# Altium footprint library General.PcbLib: 446 footprints (part 13 of 28)
Each footprint in its own frame and in the unit in brackets; x right, y up, seen from the top. Pads: shape width x height; smd on the part's side, far side on the other; paste and mask are expansions set on the pad; w line width, h text height; cw(c..) or ccw(c..) is an arc to the next point about the centre after c.
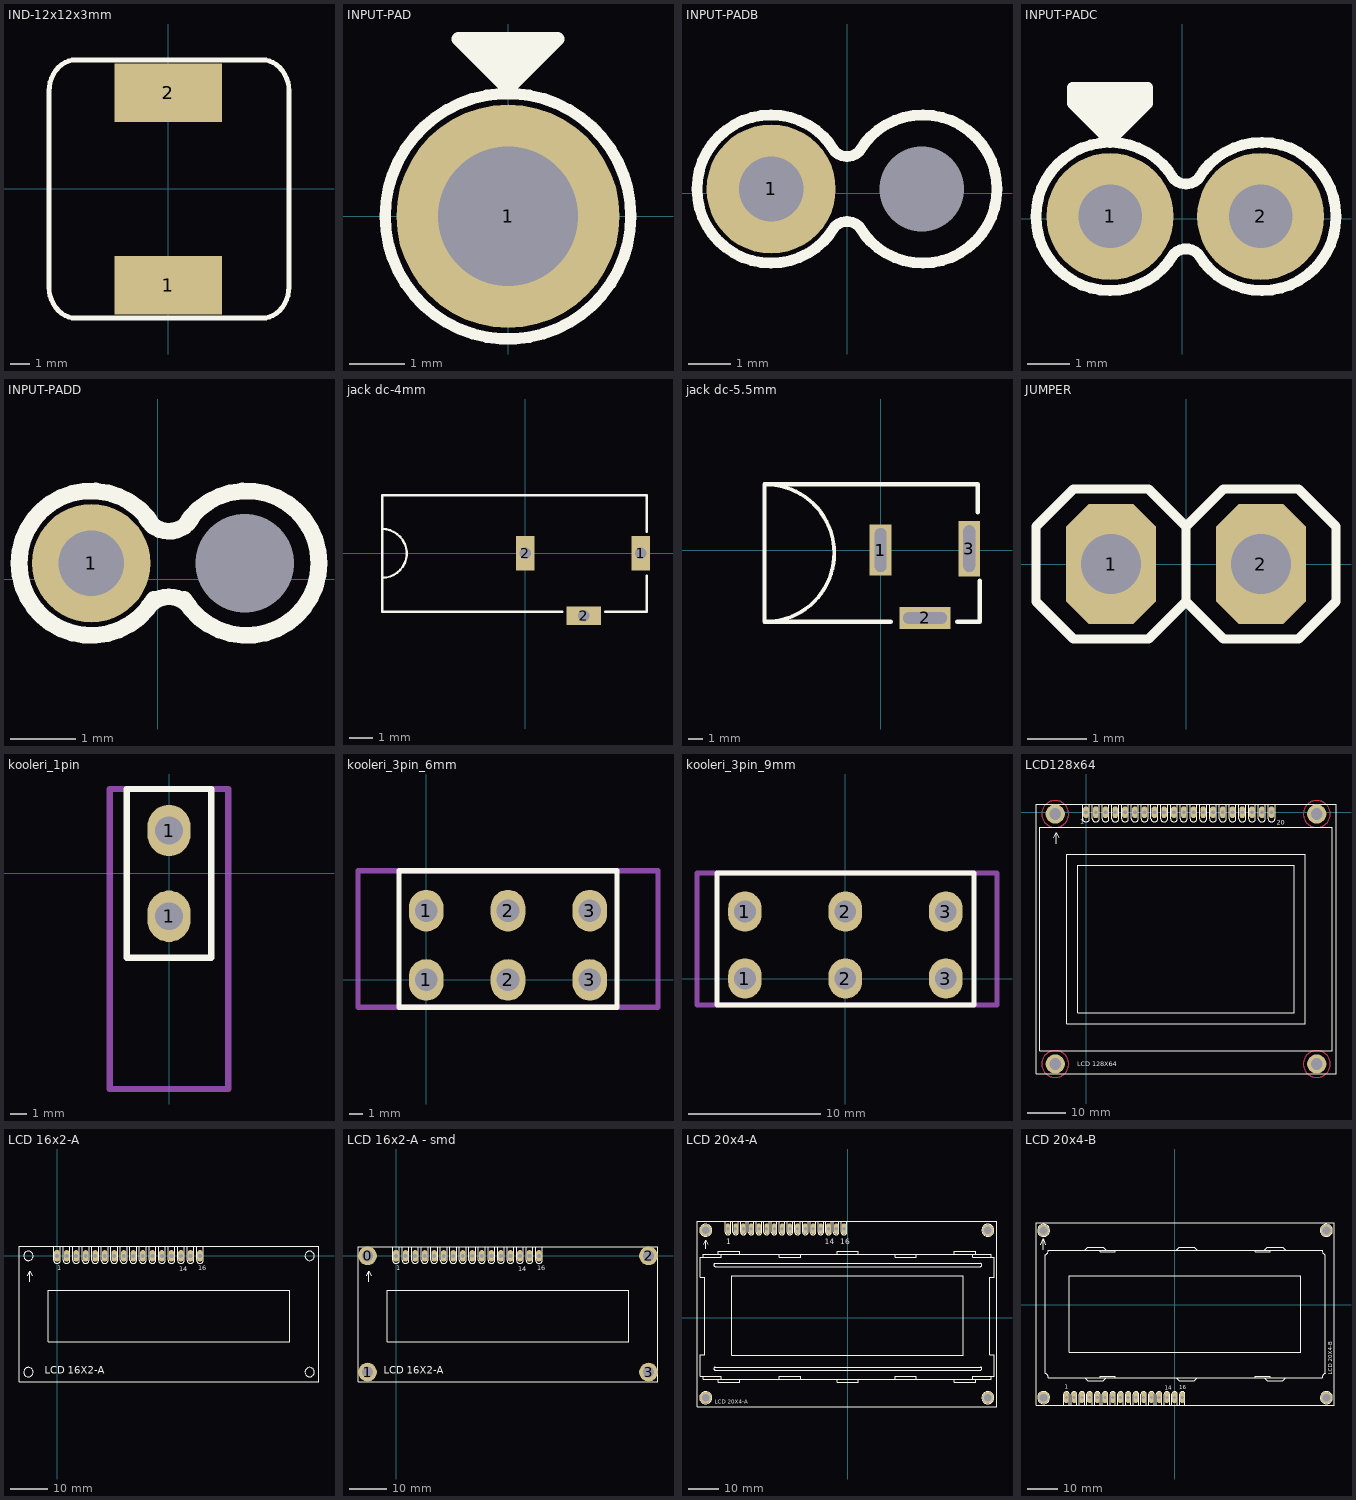
[diagram p12: the footprints below, top view; thin cyan lines are the x and y axes]

## IND-12x12x3mm [mm]
pads (2):
  rect 5.5x3 smd: 1(0,-4.978) 2(0,4.928)
Top Overlay:
  lines w0.254: -6.127,-5.059 ccw(c-4.373,-5.059) -5.613,-6.299 ccw(c-4.755,-5.441) -4.755,-6.655 ; -6.121,-5.029 -6.121,3.296 ; -6.122,-4.83 -6.122,-4.623 ; -6.122,-3.525 -6.122,4.801 -6.122,5.009 cw(c-4.368,5.009) -5.608,6.249 cw(c-4.75,5.39) -4.75,6.604 ; -4.75,-6.655 4.826,-6.655 ccw(c4.826,-5.441) 5.684,-6.299 ccw(c4.445,-5.059) 6.198,-5.059 6.198,-4.851 ; -4.674,6.604 4.831,6.604 cw(c4.831,5.39) 5.69,6.249 cw(c4.45,5.009) 6.203,5.009 6.203,4.801 6.203,-3.525 ; 6.198,-4.902 6.198,3.728
3D body "Inductor_SMD.STEP": height 5.52, standoff 0.02, extent -6.123,-6.225 6.327,6.225

## INPUT-PAD [mm]
pads (1):
  round 4 hole 2.5: 1(0,0)
Top Overlay:
  circle w0.203: c0,0 r2.2
  rectangle: -0.381,2.667 0.381,3.175
  lines w0.254: -0.635,3.175 0,2.54 0.635,3.175 ; -0.889,3.175 0,2.286 0.889,3.175 -0.889,3.175

## INPUT-PADB [mil]
pads (2):
  round 120 hole 60: 1(-70.81,3.75)
  round 0 hole 78.74 unplated: HOLE(69.19,3.75)
Top Overlay:
  lines w10: -139.71,3.75 cw(c-70.81,3.75) -11.3,38.46 ccw(c-0.26,49.5) 10.78,38.46 cw(c70.29,3.75) 139.19,3.75 cw(c70.29,3.75) 10.78,-30.97 ccw(c-0.26,-42.01) -11.3,-30.97 cw(c-70.81,3.75) -139.71,3.75

## INPUT-PADC [mm]
pads (2):
  round 3 hole 1.5: 1(-1.702,0.051) 2(1.854,0.051)
Top Overlay:
  lines w0.254: -1.702,2.083 -0.94,2.845 -0.94,2.972 -2.464,2.972 -2.464,2.845 -1.829,2.21 -1.829,2.591 -1.448,2.591 ; -1.702,3.099 -1.702,1.829 ; -2.591,2.718 -0.813,2.718 ; -2.591,2.718 -2.591,3.099 -0.813,3.099 -0.813,2.718 ; -2.591,2.718 -1.702,1.829 ; -1.702,1.829 -0.813,2.718 ; -3.452,0.051 cw(c-1.702,0.051) -0.19,0.933 ccw(c0.09,1.213) 0.371,0.933 cw(c1.882,0.051) 3.632,0.051 cw(c1.882,0.051) 0.371,-0.831 ccw(c0.09,-1.111) -0.19,-0.831 cw(c-1.702,0.051) -3.452,0.051 ; -2.337,2.845 -1.702,2.21 -1.067,2.845 -2.337,2.845

## INPUT-PADD [mm]
pads (2):
  round 1.8 hole 1: 1(-1.011,0.248)
  round 0 hole 1.5 unplated: HOLE(1.326,0.248)
Top Overlay:
  lines w0.254: -0.2,0.992 ccw(c0.171,1.13) 0.532,0.966 ; -0.171,-0.461 cw(c0.171,-0.661) 0.511,-0.456 ; -0.061,-0.307 cw(c-1.011,0.248) -2.111,0.248 cw(c-1.011,0.248) -0.061,0.802 ; 0.403,-0.307 ccw(c1.354,0.248) 2.454,0.248 ccw(c1.354,0.248) 0.403,0.802

## jack dc-4mm [mm]
pads (3):
  rect 0.8x1.5 hole 0.5 square: 1(5.004,0) 2(0,0)
  rect 1.5x0.8 hole 0.5 square: 2(2.54,-2.692)
Top Overlay:
  lines w0.1: -6.188,-1.055 ccw(c-6.188,0) -6.188,1.055 ; 1.61,-2.531 -6.188,-2.531 -6.188,2.524 5.268,2.524 5.268,0.924 ; 3.464,-2.531 5.268,-2.531 5.268,-0.956
3D body "pj-007.stp": height 7.5, standoff -3.1, extent -6.182,-2.835 5.268,2.515

## jack dc-5.5mm [mm]
pads (3):
  rect 1.5x3.5 hole 0.8 slot 3 at 90 deg: 1(0,0)
  rect 3.5x1.5 hole 0.8 slot 3 at 0 deg: 2(3.048,-4.648)
  rect 1.5x3.8 hole 0.8 slot 3.2 at 90 deg: 3(6.071,0.102)
Top Overlay:
  lines w0.254: -7.95,4.496 cw(c-7.874,-0.203) -7.905,-4.903
  lines w0.305: 0.686,-4.902 -7.95,-4.902 -7.95,4.496 6.655,4.496 6.655,2.591 ; 5.258,-4.902 6.782,-4.902 6.782,-2.108
3D body "User Library-PJ-002AH.STEP": height 11.05, standoff -3.45, extent -7.657,-4.826 6.743,4.574

## JUMPER [mil]
pads (2):
  oct 60x80 hole 40: 1(-50,0) 2(50,0)
Top Overlay:
  rectangle: 40,-10 60,10
  rectangle: -60,-10 -40,10
  lines w6: 0,-25 0,25 ; 0,-25 -25,-50 -75,-50 -100,-25 -100,25 -75,50 -25,50 0,25 ; 0,-25 25,-50 75,-50 100,-25 100,25 75,50 25,50 0,25
3D body "SW3dPS-Jumper SL2.STEP": height 374.02, standoff -102.36, extent -98.43,-48.82 98.43,51.18

## kooleri_1pin [mil] "dip"
pads (2):
  oval 100x120 hole 65: 1(0,-100) 1(0,100)
Top Overlay:
  lines w15: -98.43,-196.85 -98.43,196.85 98.43,196.85 98.43,-196.85 -98.43,-196.85
Mechanical 15:
  lines w15: -137.8,-503 -137.8,196.85 137.8,196.85 137.8,-503 -137.8,-503
3D body "koleri.STEP": height 354.33, standoff -78.74, extent -13,-501.84 18.5,143.84

## kooleri_3pin_6mm [mil] "200mil"
pads (6):
  oval 100x120 hole 65: 1(0,0) 1(0,200) 2(236.22,0) 2(236.22,200) 3(472.44,0) 3(472.44,200)
Top Overlay:
  lines w15: -78.74,-78.74 -78.74,314.96 551.18,314.96 551.18,-78.74 -78.74,-78.74
Mechanical 15:
  lines w15: -196.85,-78.74 -196.85,314.96 669.29,314.96 669.29,-78.74 -196.85,-78.74

## kooleri_3pin_9mm [mil]
pads (6):
  oval 100x120 hole 65: 1(-300,0) 1(-300,200) 2(0,0) 2(0,200) 3(300,0) 3(300,200)
Top Overlay:
  lines w15: -383.86,-78.74 -383.86,314.96 383.86,314.96 383.86,-78.74 -383.86,-78.74
Mechanical 15:
  lines w15: -442.91,-78.74 -442.91,314.96 452.76,314.96 452.76,-78.74 -442.91,-78.74

## LCD128x64 [mm]
pads (24):
  oct 1.508x3.016 hole 1: 1(0,0) 2(2.54,0) 3(5.08,0) 4(7.62,0) 5(10.16,0) 6(12.7,0) 7(15.24,0) 8(17.78,0) 9(20.32,0) 10(22.86,0) 11(25.4,0) 12(27.94,0) 13(30.48,0) 14(33.02,0) 15(35.56,0) 16(38.1,0) 17(40.64,0) 18(43.18,0) 19(45.72,0) 20(48.26,0)
  round 5 hole 3 unplated: ""(-8,-65.46) ""(-8,-0.46) ""(60,-65.46) ""(60,-0.46)
Top Layer:
  circle w0.203: c-8,-0.46 r3.502
  circle w0.203: c60,-0.46 r3.5
  circle w0.203: c-8,-65.46 r3.5
  circle w0.203: c60,-65.46 r3.502
Bottom Layer:
  circle w0.203: c-8,-0.46 r3.501
  circle w0.203: c60,-0.46 r3.502
  circle w0.203: c60,-65.46 r3.502
  circle w0.203: c-8,-65.46 r3.505
Top Overlay:
  lines w0.127: -8.382,-6.604 -7.747,-5.334 -7.112,-6.604 ; -7.747,-8.146 -7.747,-5.461 ; -0.889,1.905 -0.889,-1.651 ccw(c0,-1.651) 0.889,-1.651 0.889,1.905 ; 1.651,1.905 1.651,-1.651 ccw(c2.54,-1.651) 3.429,-1.651 3.429,1.905 ; 4.191,1.905 4.191,-1.651 ccw(c5.08,-1.651) 5.969,-1.651 5.969,1.905 ; 6.731,1.905 6.731,-1.651 ccw(c7.62,-1.651) 8.509,-1.651 8.509,1.905 ; 9.271,1.905 9.271,-1.651 ccw(c10.16,-1.651) 11.049,-1.651 11.049,1.905 ; 11.811,1.905 11.811,-1.651 ccw(c12.7,-1.651) 13.589,-1.651 13.589,1.905 ; 14.351,1.905 14.351,-1.651 ccw(c15.24,-1.651) 16.129,-1.651 16.129,1.905 ; 16.891,1.905 16.891,-1.651 ccw(c17.78,-1.651) 18.669,-1.651 18.669,1.905 ; 19.431,1.905 19.431,-1.651 ccw(c20.32,-1.651) 21.209,-1.651 21.209,1.905 ; 21.971,1.905 21.971,-1.651 ccw(c22.86,-1.651) 23.749,-1.651 23.749,1.905 ; 24.511,1.905 24.511,-1.651 ccw(c25.4,-1.651) 26.289,-1.651 26.289,1.905 ; 27.051,1.905 27.051,-1.651 ccw(c27.94,-1.651) 28.829,-1.651 28.829,1.905 ; 29.591,1.905 29.591,-1.651 ccw(c30.48,-1.651) 31.369,-1.651 31.369,1.905 ; 32.131,1.905 32.131,-1.651 ccw(c33.02,-1.651) 33.909,-1.651 33.909,1.905 ; 34.671,1.905 34.671,-1.651 ccw(c35.56,-1.651) 36.449,-1.651 36.449,1.905 ; 37.211,1.905 37.211,-1.651 ccw(c38.1,-1.651) 38.989,-1.651 38.989,1.905 ; 39.751,1.905 39.751,-1.651 ccw(c40.64,-1.651) 41.529,-1.651 41.529,1.905 ; 42.291,1.905 42.291,-1.651 ccw(c43.18,-1.651) 44.069,-1.651 44.069,1.905 ; 44.831,1.905 44.831,-1.651 ccw(c45.72,-1.651) 46.609,-1.651 46.609,1.905 ; 47.371,1.905 47.371,-1.651 ccw(c48.26,-1.651) 49.149,-1.651 49.149,1.905
  lines w0.203: -13,-67.96 -13,2.04 65,2.04 65,-67.96 -13,-67.96 ; -12,-61.96 -12,-3.96 64,-3.96 64,-61.96 -12,-61.96 ; -5,-54.96 -5,-10.96 57,-10.96 57,-54.96 -5,-54.96 ; -2.13,-52.14 -2.13,-13.79 54.14,-13.79 54.14,-52.14 -2.13,-52.14
  text "20" at 49.53,-3.302 h1.27
  text "1" at -1.524,-3.048 h1.27
  text "LCD 128X64" at -2.286,-66.04 h1.27

## LCD 16x2-A [mil]
pads (16):
  oct 60x120 hole 40: 1(0,0)
  oval 60x120 hole 40: 2(100,0) 3(200,0) 4(300,0) 5(400,0) 6(500,0) 7(600,0) 8(700,0) 9(800,0) 10(900,0) 11(1000,0) 12(1100,0) 13(1200,0) 14(1300,0) 15(1400,0) 16(1500,0)
Top Overlay:
  circle w5: c-301.58,-1220.5 r49.21
  circle w5: c2651.18,-1220.5 r49.21
  circle w5: c-301.58,0 r49.21
  circle w5: c2651.18,0 r49.21
  lines w5: -310,-210 -285,-160 -260,-210 ; -285,-270.7 -285,-165 ; -35,95 -35,-45 ccw(c0,-45) 35,-45 35,95 ; 65,95 65,-45 ccw(c100,-45) 135,-45 135,95 ; 165,95 165,-45 ccw(c200,-45) 235,-45 235,95 ; 265,95 265,-45 ccw(c300,-45) 335,-45 335,95 ; 365,95 365,-45 ccw(c400,-45) 435,-45 435,95 ; 465,95 465,-45 ccw(c500,-45) 535,-45 535,95 ; 565,95 565,-45 ccw(c600,-45) 635,-45 635,95 ; 665,95 665,-45 ccw(c700,-45) 735,-45 735,95 ; 765,95 765,-45 ccw(c800,-45) 835,-45 835,95 ; 865,95 865,-45 ccw(c900,-45) 935,-45 935,95 ; 965,95 965,-45 ccw(c1000,-45) 1035,-45 1035,95 ; 1065,95 1065,-45 ccw(c1100,-45) 1135,-45 1135,95 ; 1165,95 1165,-45 ccw(c1200,-45) 1235,-45 1235,95 ; 1265,95 1265,-45 ccw(c1300,-45) 1335,-45 1335,95 ; 1365,95 1365,-45 ccw(c1400,-45) 1435,-45 1435,95 ; 1465,95 1465,-45 ccw(c1500,-45) 1535,-45 1535,95 ; -400,-1318.93 2749.6,-1318.93 2749.6,98.4 -400,98.4 -400,-1318.93 ; -94.88,-901.6 -94.88,-358.3 2444.49,-358.3 2444.49,-901.6 -94.88,-901.6
  text "14" at 1280,-160 h50
  text "1" at 0,-150 h50
  text "16" at 1480,-150 h50
  text "LCD 16X2-A" at -130,-1240 h75
3D body "SW3dPS-LCD module 16 X 2 backlight.STEP": height 807.7, standoff 287.7, extent -405.51,-1326.77 2763.78,110.24

## LCD 16x2-A - smd [mil]
pads (20):
  round 196.85 hole 118.11: 0(-300,0) 1(-300,-1220) 2(2650,0) 3(2650,-1220)
  oct 60x120 hole 40: 1(0,0)
  oval 60x120 hole 40: 2(100,0) 3(200,0) 4(300,0) 5(400,0) 6(500,0) 7(600,0) 8(700,0) 9(800,0) 10(900,0) 11(1000,0) 12(1100,0) 13(1200,0) 14(1300,0) 15(1400,0) 16(1500,0)
Top Overlay:
  circle w5: c2651.18,0 r49.21
  circle w5: c-301.58,0 r49.21
  circle w5: c2651.18,-1220.5 r49.21
  circle w5: c-301.58,-1220.5 r49.21
  lines w5: -310,-210 -285,-160 -260,-210 ; -285,-270.7 -285,-165 ; -35,95 -35,-45 ccw(c0,-45) 35,-45 35,95 ; 65,95 65,-45 ccw(c100,-45) 135,-45 135,95 ; 165,95 165,-45 ccw(c200,-45) 235,-45 235,95 ; 265,95 265,-45 ccw(c300,-45) 335,-45 335,95 ; 365,95 365,-45 ccw(c400,-45) 435,-45 435,95 ; 465,95 465,-45 ccw(c500,-45) 535,-45 535,95 ; 565,95 565,-45 ccw(c600,-45) 635,-45 635,95 ; 665,95 665,-45 ccw(c700,-45) 735,-45 735,95 ; 765,95 765,-45 ccw(c800,-45) 835,-45 835,95 ; 865,95 865,-45 ccw(c900,-45) 935,-45 935,95 ; 965,95 965,-45 ccw(c1000,-45) 1035,-45 1035,95 ; 1065,95 1065,-45 ccw(c1100,-45) 1135,-45 1135,95 ; 1165,95 1165,-45 ccw(c1200,-45) 1235,-45 1235,95 ; 1265,95 1265,-45 ccw(c1300,-45) 1335,-45 1335,95 ; 1365,95 1365,-45 ccw(c1400,-45) 1435,-45 1435,95 ; 1465,95 1465,-45 ccw(c1500,-45) 1535,-45 1535,95 ; -400,-1318.93 -400,98.4 2749.6,98.4 2749.6,-1318.93 -400,-1318.93 ; -94.88,-901.6 2444.49,-901.6 2444.49,-358.3 -94.88,-358.3 -94.88,-901.6
  text "LCD 16X2-A" at -130,-1240 h75
  text "16" at 1480,-150 h50
  text "1" at 0,-150 h50
  text "14" at 1280,-160 h50
3D body "SW3dPS-LCD module 16 X 2 backlight.STEP": height 807.7, standoff 287.7, extent -383.86,-1374.62 2785.44,62.38

## LCD 20x4-A [mil]
pads (20):
  oct 60x140 hole 40: 1(-1550.5,1150) 2(-1450.5,1150) 3(-1350.5,1150) 4(-1250.5,1150) 5(-1150.5,1150) 6(-1050.5,1150) 7(-950.5,1150) 8(-850.5,1150) 9(-750.5,1150) 10(-650.5,1150) 11(-550.5,1150) 12(-450.5,1150) 13(-350.5,1150) 14(-250.5,1150) 15(-150.5,1150) 16(-50.5,1150)
  round 150 hole 100: P$1(-1837.5,-1035) P$2(1808.5,-1035) P$3(1808.5,1130.5) P$4(-1837.5,1130)
Top Overlay:
  drawing of 163 lines, arcs and shapes, not listed
  text "LCD 20X4-A" at -1719.69,-1112.2 h50
  text "14" at -300,950 h70
  text "16" at -100,950 h70
  text "1" at -1575,950 h70

## LCD 20x4-B [mil]
pads (20):
  oct 60x140 hole 40: 1(-1400.5,-1199) 2(-1300.5,-1199) 3(-1200.5,-1199) 4(-1100.5,-1199) 5(-1000.5,-1199) 6(-900.5,-1199) 7(-800.5,-1199) 8(-700.5,-1199) 9(-600.5,-1199) 10(-500.5,-1199) 11(-400.5,-1199) 12(-300.5,-1199) 13(-200.5,-1199) 14(-100.5,-1199) 15(-0.5,-1199) 16(99.5,-1199)
  round 150 hole 100: P$1(-1695.5,965.5) P$2(-1695.5,-1199.5) P$3(1966,-1200) P$4(1966,965.5)
Top Overlay:
  circle w5: c-1695.5,965.5 r78
  circle w5: c1966,965.5 r78
  circle w5: c1966,-1199.5 r78
  circle w5: c-1695.5,-1199.5 r78
  lines w5: -1734.95,-1199.6 -1656.21,-1199.6 ; -1734.95,965.8 -1656.21,965.8 ; -1730,778.7 -1700,859 -1675,778.7 ; -1700,716.5 -1700,844 ; -1695.58,-1239 -1695.58,-1160.2 ; -1695.58,926.4 -1695.58,1005.1 ; -1673.23,-885.9 -1673.23,649.6 ; -1673.23,-885.83 cw(c-1692.91,-941.6) -1633.86,-944.88 -1161.42,-944.9 ; -1673.23,649.53 ccw(c-1692.91,705.3) -1633.86,708.58 -1161.42,708.6 ; -1435,-1295 -1435,-1155 cw(c-1400,-1157.5) -1365,-1160 -1365,-1295 ; -1335,-1295 -1335,-1155 cw(c-1300,-1157.5) -1265,-1160 -1265,-1295 ; -1235,-1295 -1235,-1155 cw(c-1200,-1157.5) -1165,-1160 -1165,-1295 ; -1135,-1295 -1135,-1155 cw(c-1100,-1157.5) -1065,-1160 -1065,-1295 ; -1035,-1295 -1035,-1155 cw(c-1000,-1157.5) -965,-1160 -965,-1295 ; -935,-1295 -935,-1155 cw(c-900,-1157.5) -865,-1160 -865,-1295 ; -835,-1295 -835,-1155 cw(c-800,-1157.5) -765,-1160 -765,-1295 ; -735,-1295 -735,-1155 cw(c-700,-1157.5) -665,-1160 -665,-1295 ; -635,-1295 -635,-1155 cw(c-600,-1157.5) -565,-1160 -565,-1295 ; -535,-1295 -535,-1155 cw(c-500,-1157.5) -465,-1160 -465,-1295 ; -435,-1295 -435,-1155 cw(c-400,-1157.5) -365,-1160 -365,-1295 ; -335,-1295 -335,-1155 cw(c-300,-1157.5) -265,-1160 -265,-1295 ; -235,-1295 -235,-1155 cw(c-200,-1157.5) -165,-1160 -165,-1295 ; -135,-1295 -135,-1155 cw(c-100,-1157.5) -65,-1160 -65,-1295 ; -35,-1295 -35,-1155 cw(c0,-1157.5) 35,-1160 35,-1295 ; 65,-1295 65,-1155 cw(c100,-1157.5) 135,-1160 135,-1295 ; 1631.19,316.1 1631.19,375.2 ; 1926.47,-1199.6 2005.21,-1199.6 ; 1926.47,965.8 2005.21,965.8 ; 1948.82,-885.9 1948.82,649.6 ; 1948.82,-885.83 ccw(c1968.5,-941.6) 1909.45,-944.88 1437.01,-944.9 ; 1948.82,649.53 cw(c1968.5,705.3) 1909.45,708.58 1437.01,708.6 ; 1965.84,-1239 1965.84,-1160.2 ; 1965.84,926.4 1965.84,1005.1 ; -1161.42,-944.9 -1122.05,-984.3 -925.2,-984.3 -885.83,-944.9 ; -1161.42,-944.9 -964.57,-944.9 ; -1161.42,708.6 -1122.05,748 -925.2,748 -885.83,708.6 ; -1161.42,708.6 -964.57,708.6 ; -964.57,-944.9 -964.57,-925.2 -767.72,-925.2 -767.72,-944.9 ; -964.57,-944.9 -885.83,-944.9 ; -964.57,708.6 -964.57,688.9 -767.72,688.9 -767.72,708.6 ; -964.57,708.6 -885.83,708.6 ; -885.83,-944.9 -767.72,-944.9 ; -885.83,708.6 -767.72,708.6 ; -767.72,-944.9 19.68,-944.9 ; -767.72,708.6 19.68,708.6 ; 19.68,-944.9 59.05,-984.3 255.9,-984.3 295.27,-944.9 ; 19.68,-944.9 295.27,-944.9 ; 19.68,708.6 59.05,748 255.9,748 295.27,708.6 ; 19.68,708.6 295.27,708.6 ; 295.27,-944.9 1043.31,-944.9 ; 295.27,708.6 1043.31,708.6 ; 1043.31,-944.9 1043.31,-925.2 1240.16,-925.2 1240.16,-944.9 ; 1043.31,-944.9 1161.42,-944.9 ; 1043.31,708.6 1043.31,688.9 1240.16,688.9 1240.16,708.6 ; 1043.31,708.6 1161.42,708.6 ; 1161.42,-944.9 1200.79,-984.3 1397.64,-984.3 1437.01,-944.9 ; 1161.42,-944.9 1240.16,-944.9 ; 1161.42,708.6 1200.79,748 1397.64,748 1437.01,708.6 ; 1161.42,708.6 1240.16,708.6 ; 1240.16,-944.9 1437.01,-944.9 ; 1240.16,708.6 1437.01,708.6 ; 1631.19,375.2 1631.19,-609.1 -1360.93,-609.1 -1360.93,375.2 1631.19,375.2 ; -1794,-1298 -1794,1064.2 2064.27,1064.2 2064.27,-1298 -1794,-1298
  text "LCD 20X4-B" at 2040.16,-903.2 h50
  text "16" at 60,-1094 h50
  text "1" at -1420,-1084 h50
  text "14" at -130,-1100 h50